# Altium footprint library North POLE.PcbLib: 419 footprints (part 10 of 27)
Each footprint in its own frame and in the unit in brackets; x right, y up, seen from the top. Pads: shape width x height; smd on the part's side, far side on the other; paste and mask are expansions set on the pad; w line width, h text height; cw(c..) or ccw(c..) is an arc to the next point about the centre after c.
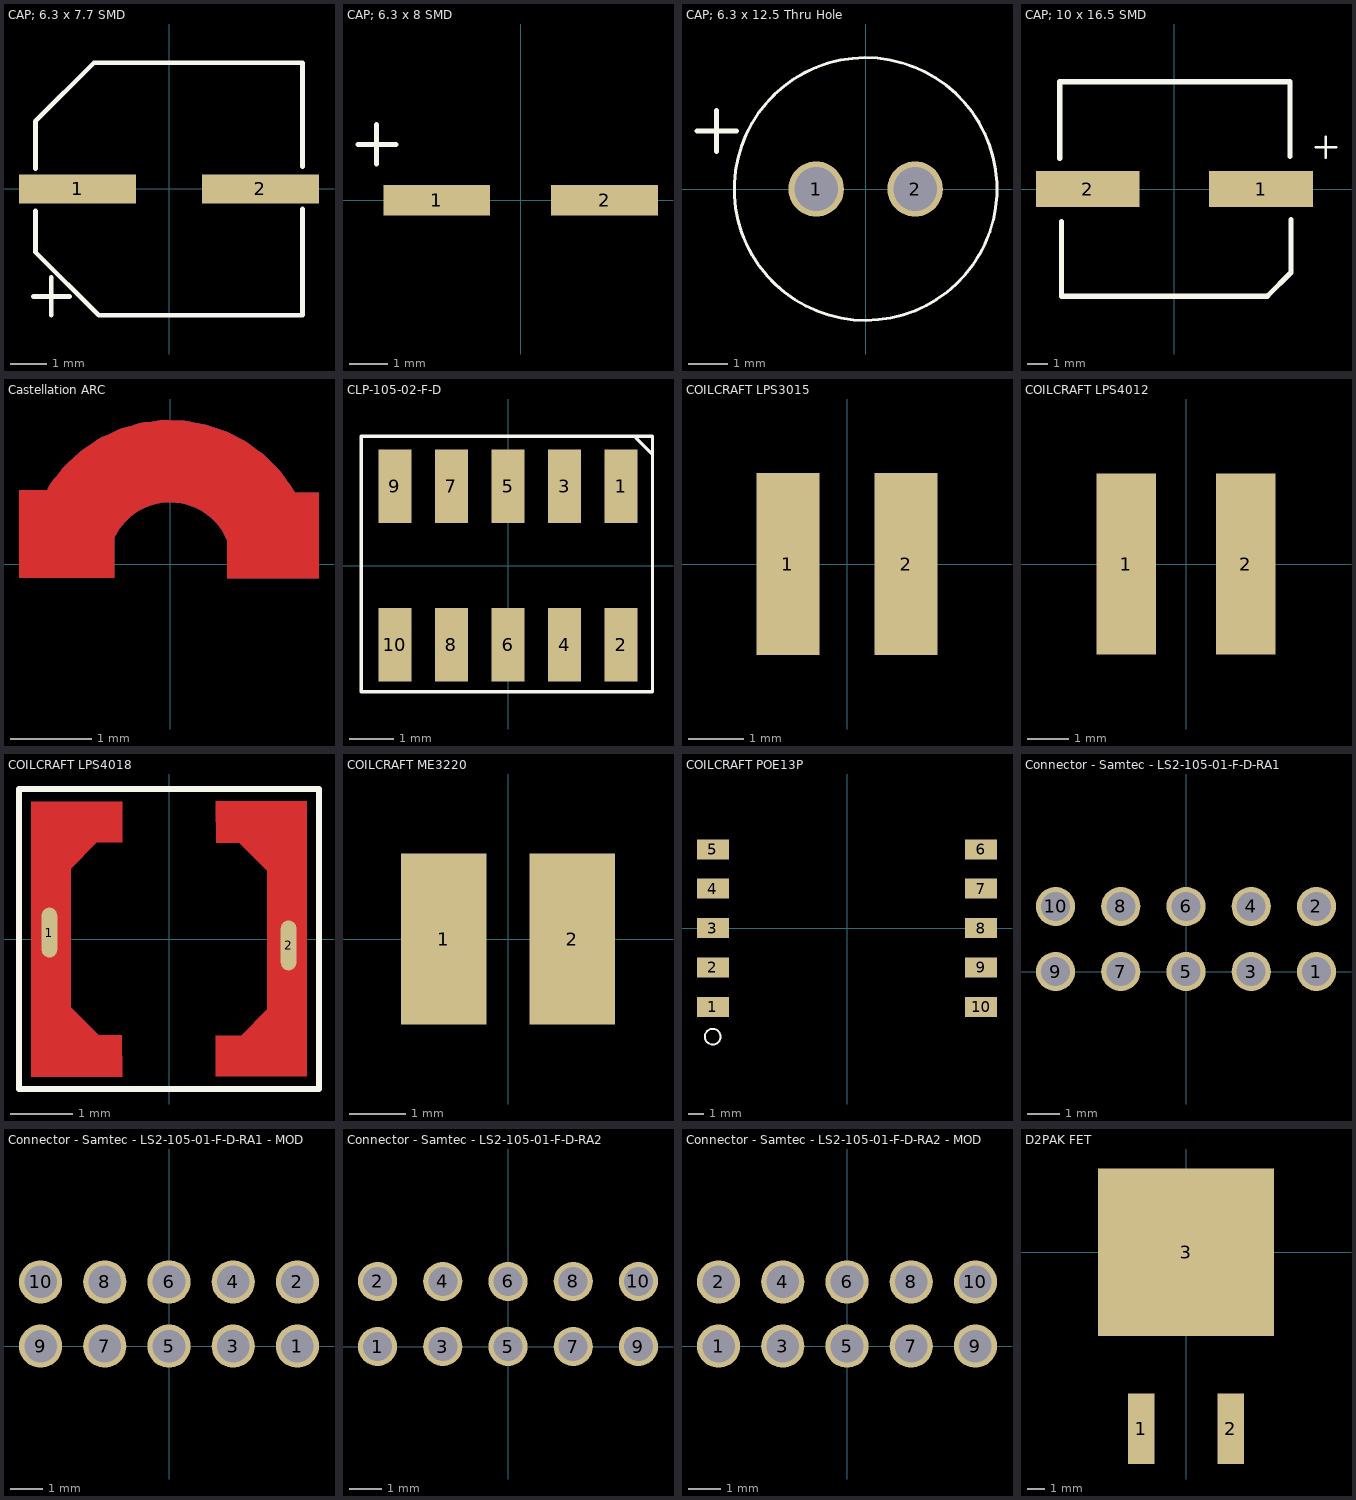
[diagram p9: the footprints below, top view; thin cyan lines are the x and y axes]

## CAP; 6.3 x 7.7 SMD [mm]
pads (2):
  rect 3.2x0.8 smd mask+0.08: 1(-2.5,0) 2(2.5,0)
Top Overlay:
  lines w0.127: -3.712,-2.94 -2.713,-2.94 ; -3.65,-0.601 -3.65,-1.725 -1.924,-3.451 3.65,-3.451 3.65,-0.551 ; -3.65,0.55 -3.65,1.85 -2.05,3.45 3.65,3.45 3.65,0.6 ; -3.223,-3.457 -3.223,-2.416
3D body: height 7.7, standoff 0, extent -3.5,-3.3 3.5,3.3

## CAP; 6.3 x 8 SMD [mm]
pads (2):
  rect 2.8x0.8 smd mask+0.08: 1(-2.2,0) 2(2.2,0)
Top Overlay:
  lines w0.127: -4.262,1.46 -3.263,1.46 ; -3.773,0.943 -3.773,1.984
3D body: height 8, standoff 0, extent -3.125,-3.144 3.15,3.144

## CAP; 6.3 x 12.5 Thru Hole [mm]
pads (2):
  round 1.4 hole 1.1: 1(-1.25,0) 2(1.25,0)
Top Overlay:
  lines w0.076: 3.282,0.493 ccw(c0,0) 3.285,0.469
  lines w0.127: -4.262,1.46 -3.263,1.46 ; -3.773,0.943 -3.773,1.984
3D body: height 12.5, standoff 0, extent -3.125,-3.144 3.15,3.144

## CAP; 10 x 16.5 SMD [mm]
pads (2):
  rect 5.08x1.778 smd mask+0.08: 1(4.24,0) 2(-4.24,0)
Top Overlay:
  lines w0.127: 6.914,2.044 7.913,2.044 ; 7.403,1.527 7.403,2.568
  lines w0.254: -5.613,1.496 -5.613,5.25 5.664,5.25 5.664,1.6 ; -5.537,-1.6 -5.537,-5.25 4.547,-5.25 ; 4.572,-5.232 5.715,-4.089 5.715,-1.496
3D body: height 17, standoff 0, extent -6.15,-5.25 6.15,5.25

## Castellation ARC [mm]
Top Layer:
  rectangle: 0.701,-0.18 1.837,0.886
  rectangle: -1.867,-0.17 -0.688,0.912
  lines w1.016: -1.144,0.553 cw(c-0.001,0.001) 1.167,0.5
Bottom Layer:
  rectangle: -1.867,-0.17 -0.688,0.912
  rectangle: 0.701,-0.18 1.837,0.886
  lines w1.016: -1.144,0.553 cw(c-0.001,0.001) 1.167,0.5
Top Solder:
  rectangle: 0.701,-0.18 1.837,0.886
  rectangle: -1.867,-0.17 -0.688,0.912
  lines w0.508: -1.048,0.121 cw(c-0.009,-0.121) 1.035,0.097
Bottom Solder:
  rectangle: -1.867,-0.17 -0.706,0.912
  rectangle: 0.701,-0.18 1.837,0.886
  lines w1.016: -1.144,0.553 cw(c-0.001,0.001) 1.167,0.5

## CLP-105-02-F-D [mil]
pads (10):
  rect 29.13x65 smd mask+3.15: 1(100,70) 2(100,-70) 3(50,70) 4(50,-70) 5(0,70) 6(0,-70) 7(-50,70) 8(-50,-70) 9(-100,70) 10(-100,-70)
Top Overlay:
  lines w3: 112.91,113.19 127.56,98.54 ; -129.72,-111.22 -129.72,114.17 127.64,114.17 127.64,-111.22 -129.72,-111.22
3D body: height 88.5, standoff 0, extent -133.49,-84.99 133.51,85

## COILCRAFT LPS3015 [mm]
pads (2):
  rect 1.14x3.3 smd mask+0.08: 1(-1.07,0) 2(1.07,0)

## COILCRAFT LPS4012 [mm]
pads (2):
  rect 1.45x4.4 smd mask+0.08: 1(-1.45,0) 2(1.45,0)
3D body: height 1.2, standoff 0, extent -2.053,-2.053 2.053,2.053

## COILCRAFT LPS4018 [mm]
pads (2):
  oval 0.25x0.8 smd mask+0.08: 1(-1.913,0.102) 2(1.913,-0.102)
Top Layer:
  region: 2.2,-2.2 2.2,2.2 0.75,2.2 0.757,1.539 1.125,1.539 1.575,1.095 1.572,-1.128 1.153,-1.544 0.747,-1.544 0.75,-2.2
  region: -2.2,2.2 -2.2,-2.2 -0.75,-2.2 -0.757,-1.539 -1.125,-1.539 -1.575,-1.095 -1.572,1.128 -1.153,1.544 -0.752,1.544 -0.75,2.2
Top Overlay:
  lines w0.1: -2.4,-2.4 2.4,-2.4 2.4,2.4 -2.4,2.4 -2.4,-2.4
Top Solder:
  region: 2.25,2.25 1.519,2.25 1.519,-2.256 2.25,-2.256
  region: 1.316,-1.488 0.691,-1.488 0.691,-2.256 1.316,-2.256
  region: 1.537,-1.488 1.298,-1.488 1.298,-2.256 1.537,-2.256
  region: 1.093,-1.51 1.326,-1.742 1.791,-1.278 1.558,-1.045
  region: 1.333,2.25 0.688,2.25 0.688,1.483 1.333,1.483
  region: 1.575,2.25 1.295,2.25 1.295,1.483 1.575,1.483
  region: 1.558,1.03 1.791,1.262 1.326,1.727 1.093,1.495
  region: -1.558,-1.03 -1.791,-1.262 -1.326,-1.727 -1.093,-1.495
  rectangle: -1.575,-2.25 -1.295,-1.483
  rectangle: -1.333,-2.25 -0.688,-1.483
  region: -1.093,1.51 -1.326,1.742 -1.791,1.278 -1.558,1.045
  rectangle: -1.537,1.488 -1.298,2.256
  rectangle: -1.316,1.488 -0.691,2.256
  rectangle: -2.25,-2.25 -1.519,2.256
3D body: height 1.8, standoff 0, extent -2.012,-2.068 2.094,2.038

## COILCRAFT ME3220 [mm]
pads (2):
  rect 1.52x3.05 smd mask+0.08: 1(-1.145,0) 2(1.145,0)
3D body: height 2.35, standoff -0.05, extent -1.75,-1.402 1.75,1.397

## COILCRAFT POE13P [mm]
pads (10):
  rect 2.03x1.27 smd mask+0.08: 1(-8.515,-5) 2(-8.515,-2.5) 3(-8.515,0) 4(-8.515,2.5) 5(-8.515,5) 6(8.515,5) 7(8.515,2.5) 8(8.515,0) 9(8.515,-2.5) 10(8.515,-5)
Top Overlay:
  lines w0.127: -8.187,-6.542 ccw(c-8.529,-6.906) -8.143,-6.589
3D body: height 12.6, standoff -0.1, extent -8.875,-6.73 8.875,6.73

## Connector - Samtec - LS2-105-01-F-D-RA1 [mm]
pads (10):
  round 1.2 hole 0.89: 1(4,0) 2(4,2) 3(2,0) 4(2,2) 5(0,0) 6(0,2) 7(-2,0) 8(-2,2) 9(-4,0) 10(-4,2)
3D body: height 5.33, standoff -2.22, extent -5.81,-0.237 5.759,10.141

## Connector - Samtec - LS2-105-01-F-D-RA1 - MOD [mil]
pads (10):
  round 53 hole 40: 1(157.48,0) 2(157.48,78.74) 3(78.74,0) 4(78.74,78.74) 5(0,0) 6(0,78.74) 7(-78.74,0) 8(-78.74,78.74) 9(-157.48,0) 10(-157.48,78.74)
3D body: height 210.04, standoff -87.44, extent -228.73,-9.34 226.73,399.24

## Connector - Samtec - LS2-105-01-F-D-RA2 [mm]
pads (10):
  round 1.2 hole 0.89: 1(-4,0) 2(-4,2) 3(-2,0) 4(-2,2) 5(0,0) 6(0,2) 7(2,0) 8(2,2) 9(4,0) 10(4,2)
3D body: height 5.39, standoff -2.17, extent -5.784,-0.281 5.785,10.097

## Connector - Samtec - LS2-105-01-F-D-RA2 - MOD [mil]
pads (10):
  round 53 hole 40: 1(-157.48,0) 2(-157.48,78.74) 3(-78.74,0) 4(-78.74,78.74) 5(0,0) 6(0,78.74) 7(78.74,0) 8(78.74,78.74) 9(157.48,0) 10(157.48,78.74)
3D body: height 212.06, standoff -85.47, extent -227.71,-11.06 227.75,397.53

## D2PAK FET [mm]
pads (3):
  rect 1.5x4 smd mask+0.08: 1(-2.54,-10) 2(2.54,-10)
  rect 10x9.5 smd mask+0.08: 3(0,0)
3D body: height 4.98, standoff -0.03, extent -5.054,-11.245 5.106,4.019